# Altium footprint library THD Miscellaneous Components.PcbLib: 30 footprints (part 1 of 2)
Each footprint in its own frame and in the unit in brackets; x right, y up, seen from the top. Pads: shape width x height; smd on the part's side, far side on the other; paste and mask are expansions set on the pad; w line width, h text height; cw(c..) or ccw(c..) is an arc to the next point about the centre after c.
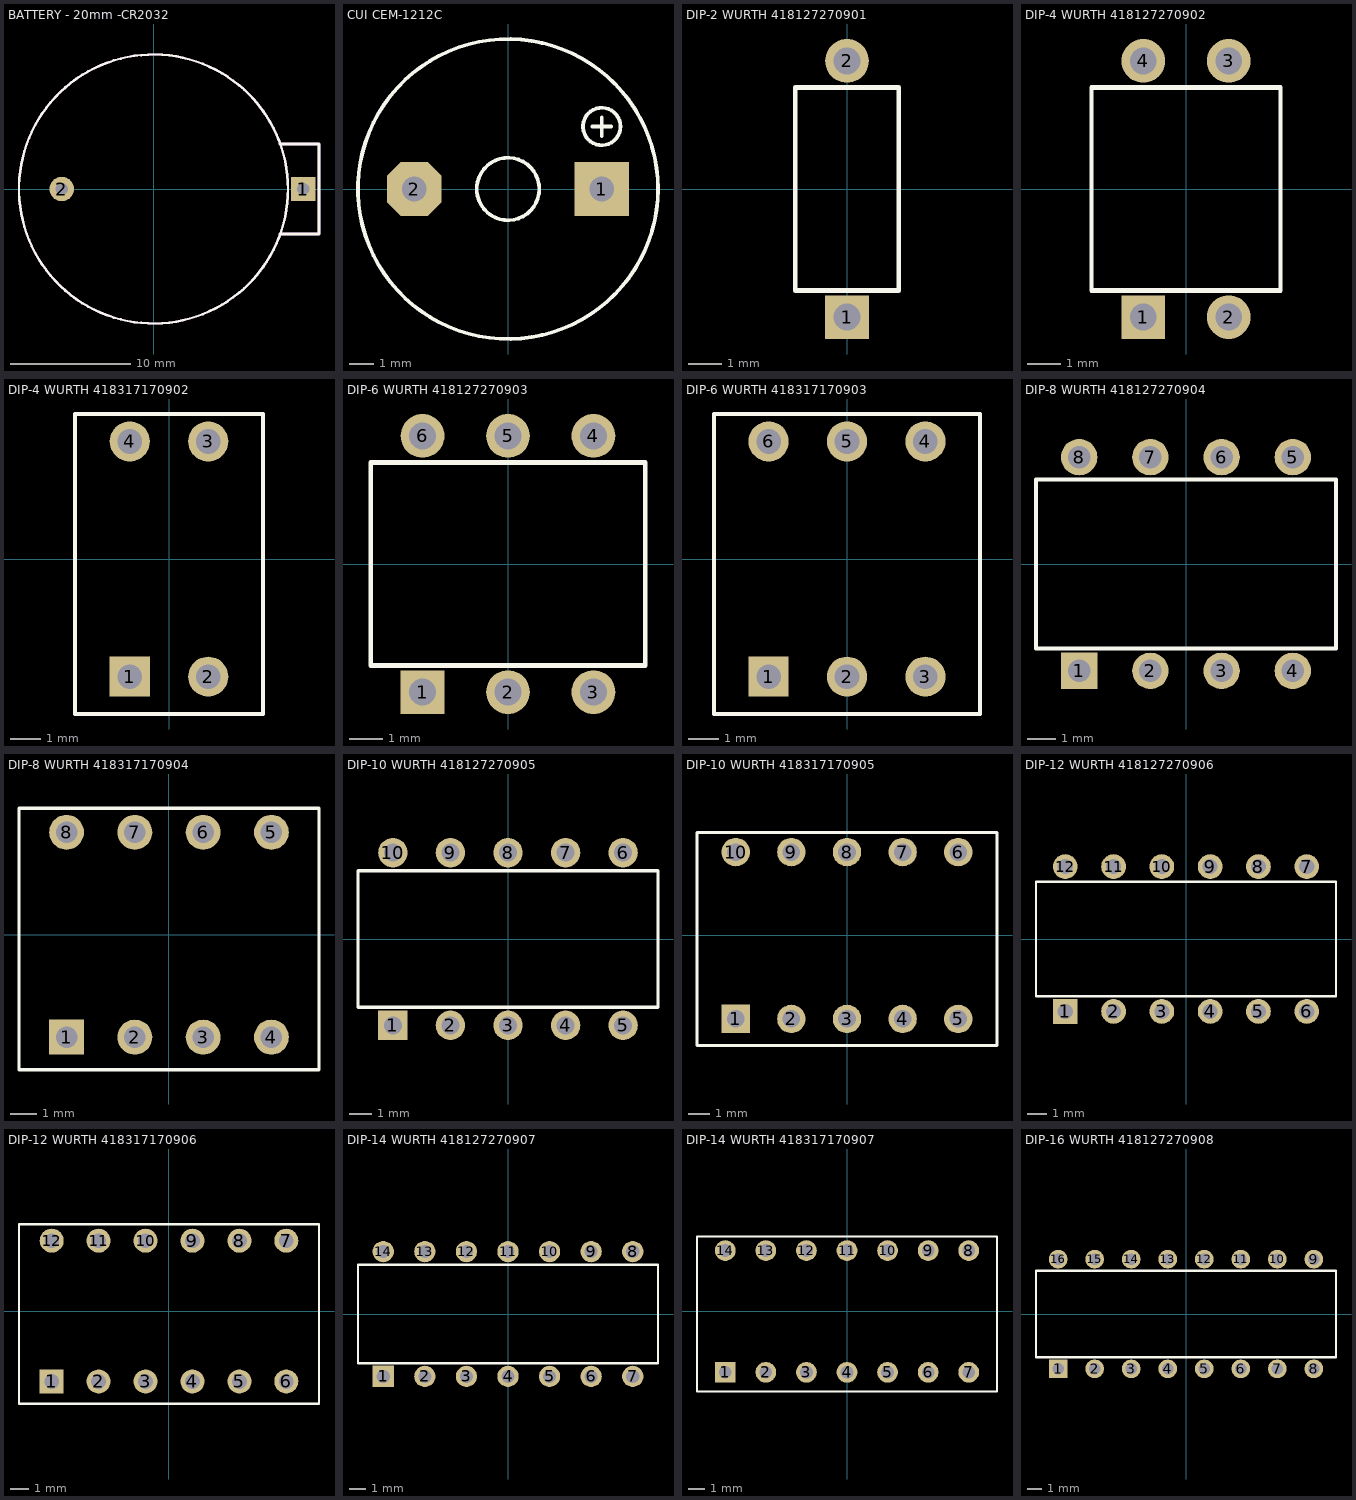
[diagram p0: the footprints below, top view; thin cyan lines are the x and y axes]

## BATTERY - 20mm -CR2032 [mil]
pads (2):
  rect 80x80 hole 40: 1(490,0)
  round 80 hole 40: 2(-300,0)
Top Overlay:
  circle w7.87: c0,0 r439.96
  lines w9.84: 413.39,-147.64 541.34,-147.64 541.34,0 541.34,147.64 413.39,147.64
Mechanical 15:
  circle w7.87: c0,0 r439.96
  lines w9.84: 413.39,-147.64 541.34,-147.64 541.34,0 541.34,147.64 413.39,147.64
3D body "BATTER-HOLDER-CR2032.STEP": height 334.65, standoff -157.48, extent -433.07,-433.07 531.5,433.07

## CUI CEM-1212C [mm]
height 9
pads (2):
  rect 2.2x2.2 hole 1: 1(3.81,0)
  oct 2.2x2.2 hole 1: 2(-3.81,0)
Top Overlay:
  circle w0.152: c0,0 r6.096
  circle w0.152: c0,0 r1.27
  circle w0.152: c3.81,2.54 r0.762
  lines w0.152: 3.429,2.54 4.191,2.54 ; 3.81,2.159 3.81,2.921
3D body "CUI CEM-1212c.STEP": height 10, standoff -4, extent -6,-6 6,6
3D body "CUI CEM-1212c.STEP": height 9.5, standoff -4.5, extent -6.096,-6.031 5.904,5.969

## DIP-2 WURTH 418127270901 [mm] "01p, 2.54mm Pitch, Horizontal, IC Type, THT, raised Actuator, black, without Tape, Tube"
height 3.9
pads (2):
  rect 1.3x1.3 hole 0.8: 1(0,-3.81)
  round 1.3 hole 0.8: 2(0,3.81)
Top Overlay:
  lines w0.127: -1.54,-3.025 -1.54,3.025 1.54,3.025 1.54,-3.025 -1.54,-3.025 ; -1.54,-3 1.54,-3 1.54,3 -1.54,3 -1.54,-3
3D body "418127270901.stp": height 3.9, standoff -3.25, extent -1.49,-3.935 1.49,3.935

## DIP-4 WURTH 418127270902 [mm] "02p, 2.54mm Pitch, Horizontal, IC Type, THT, raised Actuator, black, without Tape, Tube"
height 3.9
pads (4):
  rect 1.3x1.3 hole 0.8: 1(-1.27,-3.81)
  round 1.3 hole 0.8: 2(1.27,-3.81) 3(1.27,3.81) 4(-1.27,3.81)
Top Overlay:
  lines w0.127: -2.81,-3.025 -2.81,3.025 2.81,3.025 2.81,-3.025 -2.81,-3.025 ; -2.81,-3 2.81,-3 2.81,3 -2.81,3 -2.81,-3
3D body "418127270902.stp": height 3.9, standoff -3.25, extent -2.76,-3.935 2.76,3.935

## DIP-4 WURTH 418317170902 [mm] "02p, 2.54mm Pitch, Piano, Box Type, THT, flat Actuator, black, without Tape, Tube"
height 6.5
pads (4):
  rect 1.3x1.3 hole 0.8: 1(-1.27,-3.81)
  round 1.3 hole 0.8: 2(1.27,-3.81) 3(1.27,3.81) 4(-1.27,3.81)
Top Overlay:
  lines w0.127: -3.04,-5.02 -3.04,4.7 ; -3.04,-5.02 3.04,-5.02 ; -3.04,-5.02 -3.04,4.7 ; -3.04,-5.02 3.04,-5.02 ; -3.04,4.7 3.04,4.7 ; -3.04,4.7 3.04,4.7 ; 3.04,-5.02 3.04,4.7 ; 3.04,-5.02 3.04,4.7
3D body "418317170902.stp": height 6.5, standoff -3.85, extent -3.04,-5.02 3.04,4.7

## DIP-6 WURTH 418127270903 [mm] "03p, 2.54mm Pitch, Horizontal, IC Type, THT, raised Actuator, black, without Tape, Tube"
height 3.9
pads (6):
  rect 1.3x1.3 hole 0.8: 1(-2.54,-3.81)
  round 1.3 hole 0.8: 2(0,-3.81) 3(2.54,-3.81) 4(2.54,3.81) 5(0,3.81) 6(-2.54,3.81)
Top Overlay:
  lines w0.127: -4.08,-3.025 4.08,-3.025 4.08,3.025 -4.08,3.025 -4.08,-3.025 ; -4.08,-3 -4.08,3 4.08,3 4.08,-3 -4.08,-3
3D body "418127270903.stp": height 3.9, standoff -3.25, extent -4.03,-3.935 4.03,3.935

## DIP-6 WURTH 418317170903 [mm] "03p, 2.54mm Pitch, Piano, Box Type, THT, flat Actuator, black, without Tape, Tube"
height 6.5
pads (6):
  rect 1.3x1.3 hole 0.8: 1(-2.54,-3.81)
  round 1.3 hole 0.8: 2(0,-3.81) 3(2.54,-3.81) 4(2.54,3.81) 5(0,3.81) 6(-2.54,3.81)
Top Overlay:
  lines w0.127: -4.31,-5.02 -4.31,4.7 ; -4.31,-5.02 4.31,-5.02 ; -4.31,-5.02 -4.31,4.7 ; -4.31,-5.02 4.31,-5.02 ; -4.31,4.7 4.31,4.7 ; -4.31,4.7 4.31,4.7 ; 4.31,-5.02 4.31,4.7 ; 4.31,-5.02 4.31,4.7
3D body "418317170903.stp": height 6.5, standoff -3.85, extent -4.31,-5.02 4.31,4.7

## DIP-8 WURTH 418127270904 [mm] "04p, 2.54mm Pitch, Horizontal, IC Type, THT, raised Actuator, black, without Tape, Tube"
height 3.9
pads (8):
  rect 1.3x1.3 hole 0.8: 1(-3.81,-3.81)
  round 1.3 hole 0.8: 2(-1.27,-3.81) 3(1.27,-3.81) 4(3.81,-3.81) 5(3.81,3.81) 6(1.27,3.81) 7(-1.27,3.81) 8(-3.81,3.81)
Top Overlay:
  lines w0.127: -5.35,-3.025 5.35,-3.025 5.35,3.025 -5.35,3.025 -5.35,-3.025 ; -5.35,-3 -5.35,3 5.35,3 5.35,-3 -5.35,-3
3D body "418127270904.stp": height 3.9, standoff -3.25, extent -5.3,-3.935 5.3,3.935

## DIP-8 WURTH 418317170904 [mm] "04p, 2.54mm Pitch, Piano, Box Type, THT, flat Actuator, black, without Tape, Tube"
height 6.5
pads (8):
  rect 1.3x1.3 hole 0.8: 1(-3.81,-3.81)
  round 1.3 hole 0.8: 2(-1.27,-3.81) 3(1.27,-3.81) 4(3.81,-3.81) 5(3.81,3.81) 6(1.27,3.81) 7(-1.27,3.81) 8(-3.81,3.81)
Top Overlay:
  lines w0.127: -5.58,-5.02 -5.58,4.7 ; -5.58,-5.02 5.58,-5.02 ; -5.58,-5.02 -5.58,4.7 ; -5.58,-5.02 5.58,-5.02 ; -5.58,4.7 5.58,4.7 ; -5.58,4.7 5.58,4.7 ; 5.58,-5.02 5.58,4.7 ; 5.58,-5.02 5.58,4.7
3D body "418317170904.stp": height 6.5, standoff -3.85, extent -5.58,-5.02 5.58,4.7

## DIP-10 WURTH 418127270905 [mm] "05p, 2.54mm Pitch, Horizontal, IC Type, THT, raised Actuator, black, without Tape, Tube"
height 3.9
pads (10):
  rect 1.3x1.3 hole 0.8: 1(-5.08,-3.81)
  round 1.3 hole 0.8: 2(-2.54,-3.81) 3(0,-3.81) 4(2.54,-3.81) 5(5.08,-3.81) 6(5.08,3.81) 7(2.54,3.81) 8(0,3.81) 9(-2.54,3.81) 10(-5.08,3.81)
Top Overlay:
  lines w0.127: -6.62,-3.025 -6.62,3.025 6.62,3.025 6.62,-3.025 -6.62,-3.025 ; -6.62,-3 6.62,-3 6.62,3 -6.62,3 -6.62,-3
3D body "418127270905.stp": height 3.9, standoff -3.25, extent -6.57,-3.935 6.57,3.935

## DIP-10 WURTH 418317170905 [mm] "05p, 2.54mm Pitch, Piano, Box Type, THT, flat Actuator, black, without Tape, Tube"
height 6.5
pads (10):
  rect 1.3x1.3 hole 0.8: 1(-5.08,-3.81)
  round 1.3 hole 0.8: 2(-2.54,-3.81) 3(0,-3.81) 4(2.54,-3.81) 5(5.08,-3.81) 6(5.08,3.81) 7(2.54,3.81) 8(0,3.81) 9(-2.54,3.81) 10(-5.08,3.81)
Top Overlay:
  lines w0.127: -6.85,-5.02 -6.85,4.7 ; -6.85,-5.02 6.85,-5.02 ; -6.85,-5.02 -6.85,4.7 ; -6.85,-5.02 6.85,-5.02 ; -6.85,4.7 6.85,4.7 ; -6.85,4.7 6.85,4.7 ; 6.85,-5.02 6.85,4.7 ; 6.85,-5.02 6.85,4.7
3D body "418317170905.stp": height 6.5, standoff -3.85, extent -6.85,-5.02 6.85,4.7

## DIP-12 WURTH 418127270906 [mm] "06p, 2.54mm Pitch, Horizontal, IC Type, THT, raised Actuator, black, without Tape, Tube"
height 3.9
pads (12):
  rect 1.3x1.3 hole 0.8: 1(-6.35,-3.81)
  round 1.3 hole 0.8: 2(-3.81,-3.81) 3(-1.27,-3.81) 4(1.27,-3.81) 5(3.81,-3.81) 6(6.35,-3.81) 7(6.35,3.81) 8(3.81,3.81) 9(1.27,3.81) 10(-1.27,3.81) 11(-3.81,3.81) 12(-6.35,3.81)
Top Overlay:
  lines w0.127: -7.89,-3.025 -7.89,3.025 7.89,3.025 7.89,-3.025 -7.89,-3.025 ; -7.89,-3 7.89,-3 7.89,3 -7.89,3 -7.89,-3
3D body "418127270906.stp": height 3.9, standoff -3.25, extent -7.84,-3.935 7.84,3.935

## DIP-12 WURTH 418317170906 [mm] "06p, 2.54mm Pitch, Piano, Box Type, THT, flat Actuator, black, without Tape, Tube"
height 6.5
pads (12):
  rect 1.3x1.3 hole 0.8: 1(-6.35,-3.81)
  round 1.3 hole 0.8: 2(-3.81,-3.81) 3(-1.27,-3.81) 4(1.27,-3.81) 5(3.81,-3.81) 6(6.35,-3.81) 7(6.35,3.81) 8(3.81,3.81) 9(1.27,3.81) 10(-1.27,3.81) 11(-3.81,3.81) 12(-6.35,3.81)
Top Overlay:
  lines w0.127: -8.12,-5.02 -8.12,4.7 ; -8.12,-5.02 8.12,-5.02 ; -8.12,-5.02 -8.12,4.7 ; -8.12,-5.02 8.12,-5.02 ; -8.12,4.7 8.12,4.7 ; -8.12,4.7 8.12,4.7 ; 8.12,-5.02 8.12,4.7 ; 8.12,-5.02 8.12,4.7
3D body "418317170906.stp": height 6.5, standoff -3.85, extent -8.12,-5.02 8.12,4.7

## DIP-14 WURTH 418127270907 [mm] "07p, 2.54mm Pitch, Horizontal, IC Type, THT, raised Actuator, black, without Tape, Tube"
height 3.9
pads (14):
  rect 1.3x1.3 hole 0.8: 1(-7.62,-3.81)
  round 1.3 hole 0.8: 2(-5.08,-3.81) 3(-2.54,-3.81) 4(0,-3.81) 5(2.54,-3.81) 6(5.08,-3.81) 7(7.62,-3.81) 8(7.62,3.81) 9(5.08,3.81) 10(2.54,3.81) 11(0,3.81) 12(-2.54,3.81) 13(-5.08,3.81) 14(-7.62,3.81)
Top Overlay:
  lines w0.127: -9.16,-3.025 9.16,-3.025 9.16,3.025 -9.16,3.025 -9.16,-3.025 ; -9.16,-3 -9.16,3 9.16,3 9.16,-3 -9.16,-3
3D body "418127270907.stp": height 3.9, standoff -3.25, extent -9.11,-3.935 9.11,3.935

## DIP-14 WURTH 418317170907 [mm] "07p, 2.54mm Pitch, Piano, Box Type, THT, flat Actuator, black, without Tape, Tube"
height 6.5
pads (14):
  rect 1.3x1.3 hole 0.8: 1(-7.62,-3.81)
  round 1.3 hole 0.8: 2(-5.08,-3.81) 3(-2.54,-3.81) 4(0,-3.81) 5(2.54,-3.81) 6(5.08,-3.81) 7(7.62,-3.81) 8(7.62,3.81) 9(5.08,3.81) 10(2.54,3.81) 11(0,3.81) 12(-2.54,3.81) 13(-5.08,3.81) 14(-7.62,3.81)
Top Overlay:
  lines w0.127: -9.39,-5.02 -9.39,4.7 ; -9.39,-5.02 9.39,-5.02 ; -9.39,-5.02 -9.39,4.7 ; -9.39,-5.02 9.39,-5.02 ; -9.39,4.7 9.39,4.7 ; -9.39,4.7 9.39,4.7 ; 9.39,-5.02 9.39,4.7 ; 9.39,-5.02 9.39,4.7
3D body "418317170907.stp": height 6.5, standoff -3.85, extent -9.39,-5.02 9.39,4.7

## DIP-16 WURTH 418127270908 [mm] "08p, 2.54mm Pitch, Horizontal, IC Type, THT, raised Actuator, black, without Tape, Tube"
height 3.9
pads (16):
  rect 1.3x1.3 hole 0.8: 1(-8.89,-3.81)
  round 1.3 hole 0.8: 2(-6.35,-3.81) 3(-3.81,-3.81) 4(-1.27,-3.81) 5(1.27,-3.81) 6(3.81,-3.81) 7(6.35,-3.81) 8(8.89,-3.81) 9(8.89,3.81) 10(6.35,3.81) 11(3.81,3.81) 12(1.27,3.81) 13(-1.27,3.81) 14(-3.81,3.81) 15(-6.35,3.81) 16(-8.89,3.81)
Top Overlay:
  lines w0.127: -10.43,-3.025 -10.43,3.025 10.43,3.025 10.43,-3.025 -10.43,-3.025 ; -10.43,-3 10.43,-3 10.43,3 -10.43,3 -10.43,-3
3D body "418127270908.stp": height 3.9, standoff -3.25, extent -10.38,-3.935 10.38,3.935